# Altium footprint library 元件1.PcbLib: 420 footprints (part 14 of 27)
Each footprint in its own frame and in the unit in brackets; x right, y up, seen from the top. Pads: shape width x height; smd on the part's side, far side on the other; paste and mask are expansions set on the pad; w line width, h text height; cw(c..) or ccw(c..) is an arc to the next point about the centre after c.
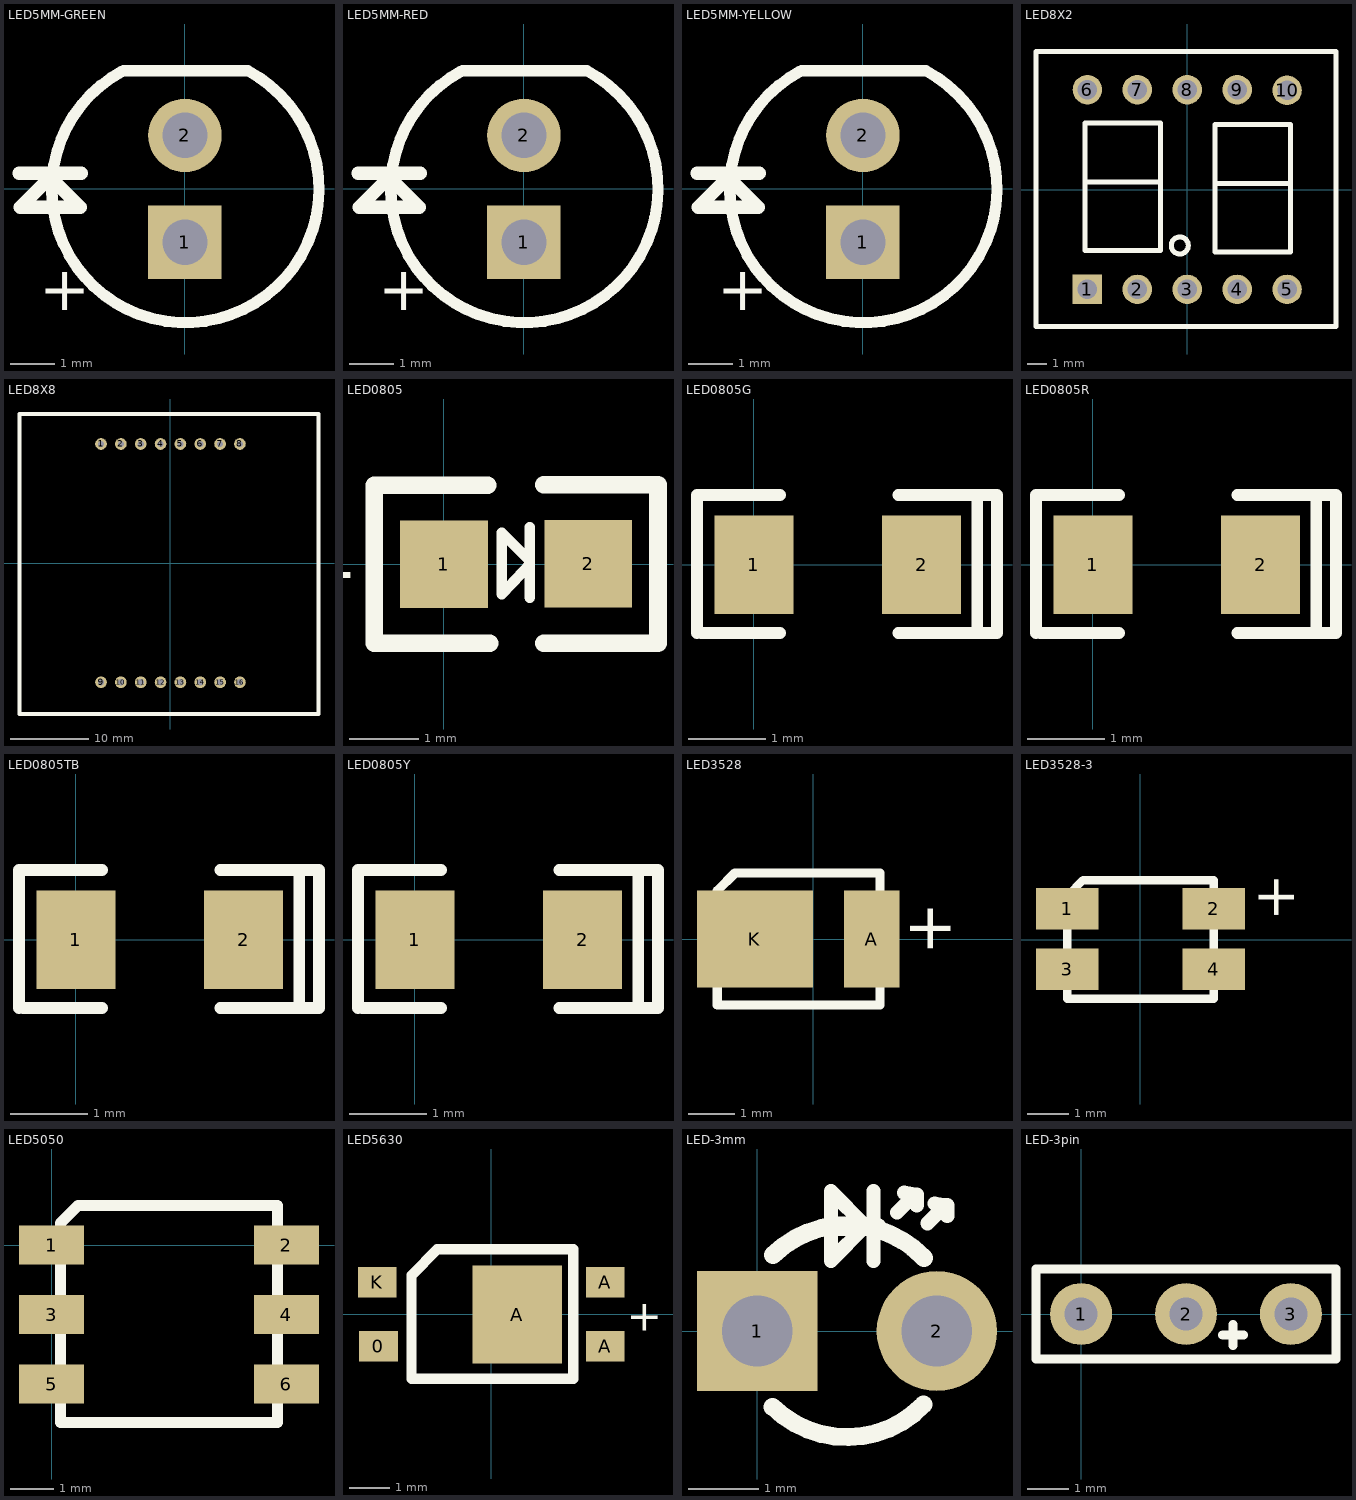
[diagram p13: the footprints below, top view; thin cyan lines are the x and y axes]

## LED5MM-GREEN [mm]
pads (2):
  rect 1.65x1.651 hole 1.016 mask+0.03: 1(0,-1.2)
  oval 1.65x1.651 hole 1.016 mask+0.03: 2(0,1.2)
Top Overlay:
  lines w0.254: -1.4,2.644 ccw(c0.009,-0.005) 1.411,2.647 -1.378,2.647
  lines w0.3: -3.725,0.351 -2.328,0.351 ; -3.7,-0.411 -3.027,0.262 -2.354,-0.411 -2.608,-0.411 -3.7,-0.411
  text "+" at -3.268,-2.723 h1
3D body "LED5_GRE.STEP": height 8.8, standoff -1.8, extent -2.87,-2.802 2.829,2.548

## LED5MM-RED [mm]
pads (2):
  rect 1.65x1.651 hole 1.016 mask+0.03: 1(0,-1.2)
  oval 1.65x1.651 hole 1.016 mask+0.03: 2(0,1.2)
Top Overlay:
  lines w0.254: -1.4,2.644 ccw(c0.009,-0.005) 1.411,2.647 -1.378,2.647
  lines w0.3: -3.725,0.351 -2.328,0.351 ; -3.7,-0.411 -3.027,0.262 -2.354,-0.411 -2.608,-0.411 -3.7,-0.411
  text "+" at -3.268,-2.723 h1
3D body "LED5_RED.STEP": height 8.6, standoff -2, extent -2.846,-2.891 2.853,2.459

## LED5MM-YELLOW [mm]
pads (2):
  rect 1.65x1.651 hole 1.016 mask+0.03: 1(0,-1.2)
  oval 1.65x1.651 hole 1.016 mask+0.03: 2(0,1.2)
Top Overlay:
  lines w0.254: -1.4,2.644 ccw(c0.009,-0.005) 1.411,2.647 -1.378,2.647
  lines w0.3: -3.725,0.351 -2.328,0.351 ; -3.7,-0.411 -3.027,0.262 -2.354,-0.411 -2.608,-0.411 -3.7,-0.411
  text "+" at -3.268,-2.723 h1
3D body "LED5_YEL.STEP": height 8.6, standoff -2, extent -2.85,-2.824 2.85,2.526

## LED8X2 [mm] "DIP; 16 Leads; Row Spacing 7.62 mm; Pitch 2.54 mm"
pads (10):
  rect 1.5x1.5 hole 1: 1(-5.08,-5.08)
  round 1.5 hole 1: 2(-2.54,-5.08) 3(0,-5.08) 4(2.54,-5.08) 5(5.08,-5.08) 6(-5.08,5.08) 7(-2.54,5.08) 8(0,5.08) 9(2.54,5.08) 10(5.08,5.049)
Top Overlay:
  circle w0.254: c-0.381,-2.845 r0.434
  lines w0.254: -5.156,0.381 -1.372,0.381 ; 1.473,0.305 5.258,0.305 ; -7.696,-6.96 7.569,-6.96 7.569,7.015 -7.696,7.015 -7.696,-6.96 ; -5.207,-3.099 -5.207,3.378 -1.372,3.378 -1.372,-3.099 -5.207,-3.099 ; 1.422,-3.175 5.258,-3.175 5.258,3.302 1.422,3.302 1.422,-3.175
3D body "LED Digital Tube 8X2.STEP": height 7.2, standoff -1.9, extent -7.551,-6.985 7.449,7.015

## LED8X8 [mm]
pads (16):
  round 1.5 hole 0.8: 1(-8.89,15.253) 2(-6.35,15.253) 3(-3.81,15.253) 4(-1.27,15.253) 5(1.27,15.253) 6(3.81,15.253) 7(6.35,15.253) 8(8.89,15.253) 9(-8.89,-15.253) 10(-6.35,-15.253) 11(-3.81,-15.253) 12(-1.27,-15.253) 13(1.27,-15.253) 14(3.81,-15.253) 15(6.35,-15.253) 16(8.89,-15.253)
Top Overlay:
  lines w0.508: -19.355,-19.317 -19.355,19.088 18.974,19.088 18.974,-19.317 -19.355,-19.317
3D body "38x38_8x8_LED.step": height 10.4, standoff -4, extent -19.3,-19.313 19,18.987

## LED0805 [mm] "1/8W"
pads (2):
  rect 1.27x1.27 smd: 1(0,0) 2(2.09,0.005)
Top Overlay:
  lines w0.152: 1.245,-0.483 1.245,0.533 ; 1.245,0 0.838,-0.432 0.838,0.457 1.245,0.051
  lines w0.254: 0.635,1.143 -1.011,1.143 -1.011,-1.143 0.66,-1.143 ; 1.448,-1.143 3.099,-1.143 3.099,1.148 1.448,1.148
  text "+" at -1.245,-0.483 h0.76
3D body: height 0.5, standoff 0, extent 0.051,-0.635 0.279,0.635
3D body: height 0.5, standoff 0, extent 1.803,-0.635 2.032,0.635
3D body: height 0.5, standoff 0, extent 0.279,-0.635 1.803,0.635
3D body: height 0.46, standoff 0, extent 0.774,-0.254 1.309,0.305

## LED0805G [mil]
pads (2):
  rect 40x50 smd: 1(0,0) 2(85,0)
Top Overlay:
  lines w5.98: 113.15,-34.61 123.15,-34.61 ; 113.15,35.39 123.15,35.39
  lines w6: -28.86,-34.61 -28.86,35.39 13.15,35.39 ; -26.85,-34.61 13.15,-34.61 ; 73.15,-34.61 113.15,-34.61 113.15,35.39 73.15,35.39 ; 123.15,-34.61 123.15,35.39
3D body "User Library-User Library-led_0805 GRE.STEP": height 43.31, standoff 0, extent 3.39,-24.21 82.91,25

## LED0805R [mil]
pads (2):
  rect 40x50 smd: 1(0,0) 2(85,0)
Top Overlay:
  lines w5.98: 113.15,-34.61 123.15,-34.61 ; 113.15,35.39 123.15,35.39
  lines w6: -28.86,-34.61 -28.86,35.39 13.15,35.39 ; -26.85,-34.61 13.15,-34.61 ; 73.15,-34.61 113.15,-34.61 113.15,35.39 73.15,35.39 ; 123.15,-34.61 123.15,35.39
3D body "User Library-led_0805.STEP": height 43.31, standoff 0, extent 3.39,-24.21 82.91,25

## LED0805TB [mil]
pads (2):
  rect 40x50 smd: 1(0,0) 2(85,0)
Top Overlay:
  lines w5.98: 113.15,-34.61 123.15,-34.61 ; 113.15,35.39 123.15,35.39
  lines w6: -28.86,-34.61 -28.86,35.39 13.15,35.39 ; -26.85,-34.61 13.15,-34.61 ; 73.15,-34.61 113.15,-34.61 113.15,35.39 73.15,35.39 ; 123.15,-34.61 123.15,35.39
3D body "SW3dPS-LED SMD0805.STEP": height 33.45, standoff 0.23, extent -2.07,-17.71 79.13,17.97

## LED0805Y [mil]
pads (2):
  rect 40x50 smd: 1(0,0) 2(85,0)
Top Overlay:
  lines w5.98: 113.15,-34.61 123.15,-34.61 ; 113.15,35.39 123.15,35.39
  lines w6: -28.86,-34.61 -28.86,35.39 13.15,35.39 ; -26.85,-34.61 13.15,-34.61 ; 73.15,-34.61 113.15,-34.61 113.15,35.39 73.15,35.39 ; 123.15,-34.61 123.15,35.39
3D body "User Library-User Library-led_0805 YEL.STEP": height 43.31, standoff 0, extent 3.39,-24.21 82.92,25

## LED3528 [mm]
pads (2):
  rect 1.2x2.1 smd: A(1.257,0)
  rect 2.5x2.1 smd: K(-1.257,0)
Top Overlay:
  lines w0.2: -2.07,-1.422 -2.07,1.041 -1.689,1.422 1.435,1.422 1.435,-1.422 -2.07,-1.422
  text "+" at 2.959,-0.356 h1
3D body "LED3528.step": height 1.8, standoff 0, extent -2.093,-1.4 1.407,1.4

## LED3528-3 [mm]
pads (4):
  rect 1.5x1 smd: 1(-1.753,0.737) 2(1.753,0.737) 3(-1.753,-0.711) 4(1.753,-0.711)
Top Overlay:
  lines w0.2: -1.753,-1.422 1.753,-1.422 1.753,1.422 -1.372,1.422 -1.753,1.041 -1.753,-1.422
  text "+" at 3.683,0.436 h1
Mechanical 2:
  text "+" at 0.508,-0.33 h1
3D body "LED3528.step": height 1.8, standoff 0, extent -1.775,-1.4 1.725,1.4

## LED5050 [mm]
pads (6):
  rect 1.5x0.9 smd: 1(0,0) 2(5.41,0) 3(0,-1.6) 4(5.41,-1.6) 5(0,-3.2) 6(5.41,-3.2)
Top Overlay:
  lines w0.254: 0.686,0.914 5.207,0.914 5.207,-4.089 0.203,-4.089 0.203,0.508 0.61,0.914 0.991,0.914
3D body "User Library-smd_led_5050.step": height 1.6, standoff 0, extent 0.073,-4.075 5.373,0.925

## LED5630 [mm]
pads (5):
  rect 0.95x0.75 smd: 0(-2.769,-0.781) A(2.794,-0.781) A(2.794,0.781) K(-2.794,0.781)
  rect 2.2x2.4 smd: A(0.635,-0.006)
Top Overlay:
  lines w0.254: -1.956,-1.581 2.007,-1.581 2.007,1.594 -1.321,1.594 -1.956,0.959 -1.956,-1.581
  text "+" at 3.327,-0.4 h0.76
3D body "User Library-5630.step": height 0.95, standoff -0.01, extent -2.775,-1.457 2.826,1.543

## LED-3mm [mm]
pads (2):
  rect 1.7x1.7 hole 1: 1(0,0)
  round 1.7 hole 1: 2(2.54,0)
Top Overlay:
  lines w0.2: 1.646,0.991 1.646,1.981 ; 1.976,1.675 2.23,1.929 2.078,1.955 ; 2.256,1.777 2.256,1.929 ; 2.408,1.523 2.662,1.777 2.51,1.802 ; 2.688,1.625 2.688,1.777 ; 1.041,0.994 1.532,1.485 1.041,1.975 1.041,0.994
  lines w0.254: 0.22,-1.071 ccw(c1.27,0) 2.352,-1.038 ; 0.224,1.075 cw(c1.27,0) 2.356,1.035 ; 0.991,1.473 1.702,1.473
3D body "LED-RED3.STEP": height 5.38, standoff -3.17, extent -0.722,-2.019 3.262,1.473

## LED-3pin [mm]
pads (3):
  round 1.5 hole 0.8: 1(0,0) 2(2.54,0) 3(5.08,0)
Top Overlay:
  lines w0.22: 3.429,-0.508 3.937,-0.508 ; 3.683,-0.762 3.683,-0.254 ; -1.092,-1.092 -1.092,1.092 6.172,1.092 6.172,-1.092 -1.092,-1.092
3D body "User Library-L-115WEGW-CA.STEP": height 8.13, standoff -3.9, extent -0.25,-1.5 5.33,2